# Altium footprint library discrete.PcbLib: 79 footprints (part 3 of 5)
Each footprint in its own frame and in the unit in brackets; x right, y up, seen from the top. Pads: shape width x height; smd on the part's side, far side on the other; paste and mask are expansions set on the pad; w line width, h text height; cw(c..) or ccw(c..) is an arc to the next point about the centre after c.
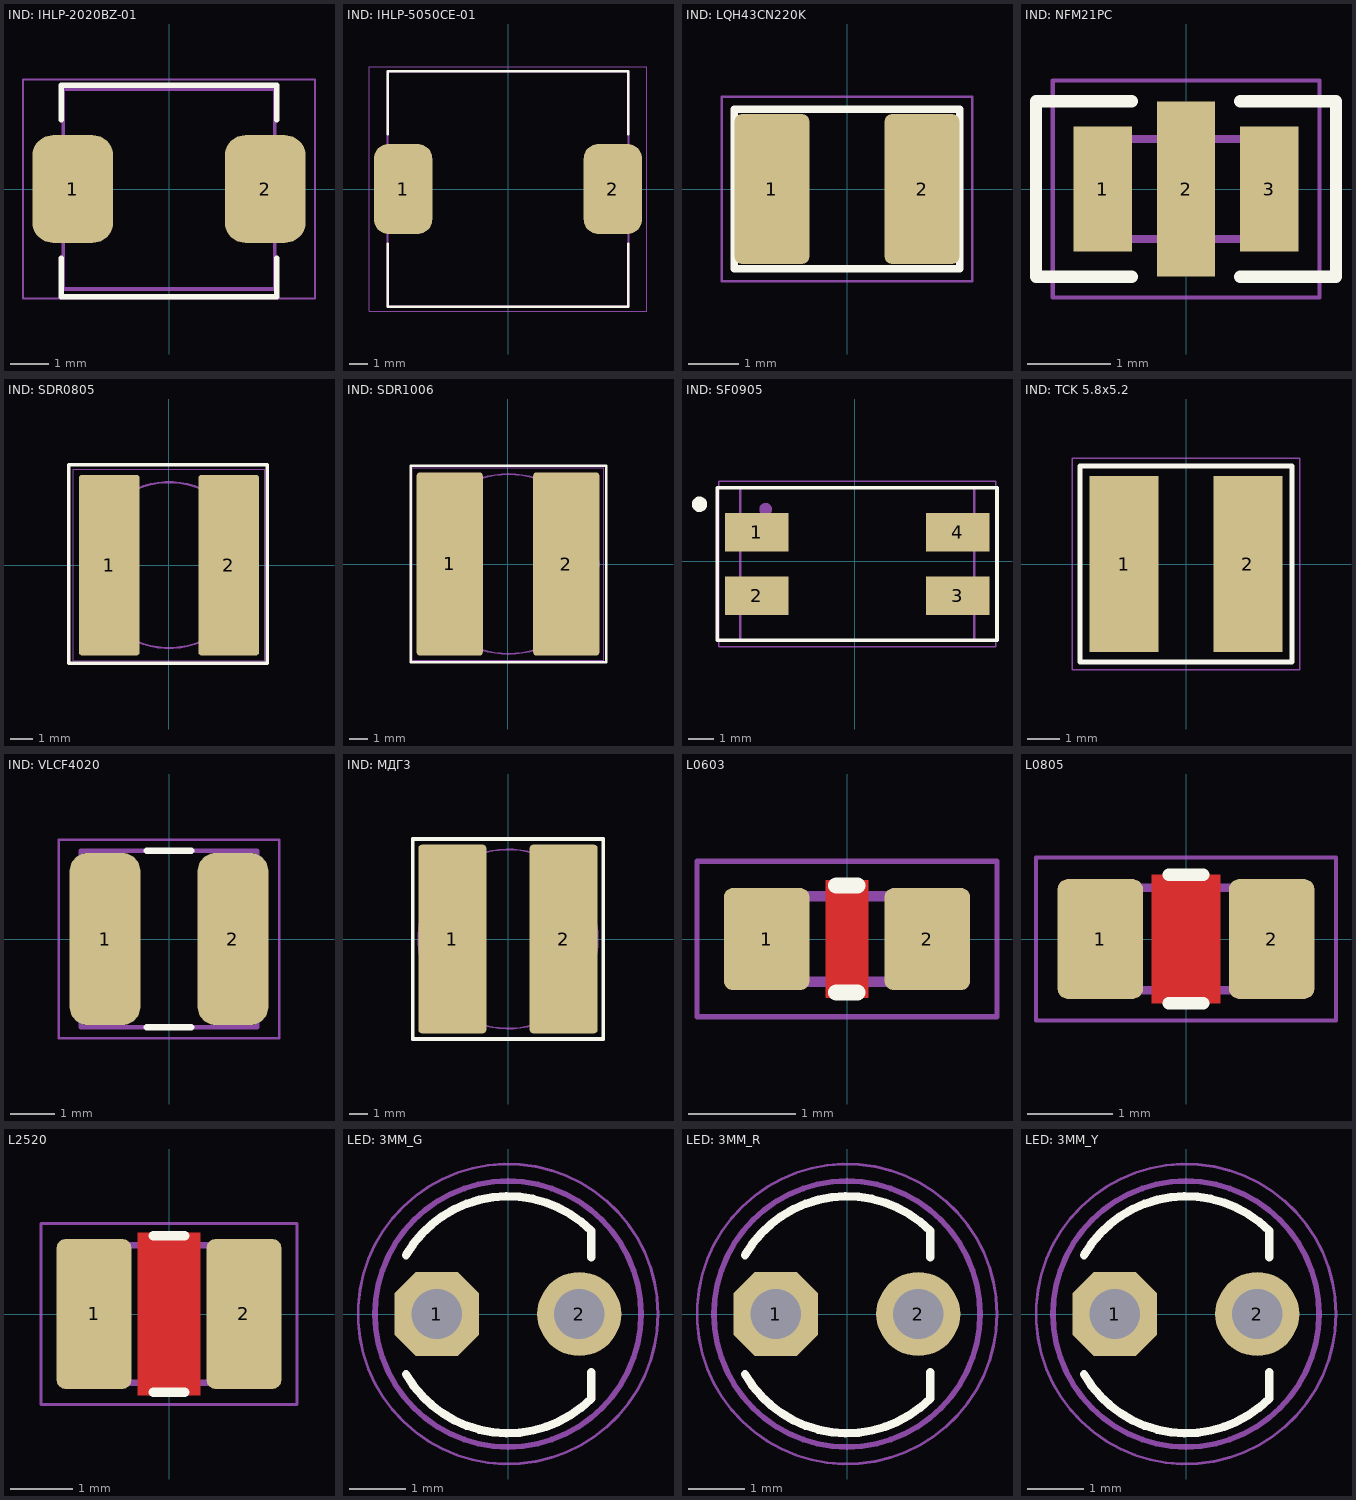
[diagram p2: the footprints below, top view; thin cyan lines are the x and y axes]

## IND: IHLP-2020BZ-01 [mm]
pads (2):
  rrect50% 2.1x2.8 smd: 1(-2.5,0) 2(2.5,0)
Top Overlay:
  lines w0.15: -2.8,-1.8 -2.8,-2.8 2.8,-2.8 2.8,-1.8 ; -2.8,1.8 -2.8,2.7 2.8,2.7 2.8,1.8
Top Assy:
  lines w0.1: -2.75,-2.6 -2.75,2.6 2.75,2.6 2.75,-2.6 -2.75,-2.6
  text ".Designator" at -1.325,-0.433 h1.25
Top Cortyard:
  lines w0.05: -3.8,-2.85 3.8,-2.85 3.8,2.85 -3.8,2.85 -3.8,-2.85
3D body "User Library-IHLP-2020BZ-01.step": height 2, standoff 0, extent -2.745,-2.59 2.745,2.59

## IND: IHLP-5050CE-01 [mm]
pads (2):
  rrect50% 3.2x4.95 smd: 1(-5.75,0) 2(5.75,0)
Top Overlay:
  lines w0.15: -6.6,-3 -6.6,-6.45 6.6,-6.45 6.6,-3 ; -6.6,3 -6.6,6.45 6.6,6.45 6.6,3
Top Assy:
  lines w0.1: -6.6,-6.45 6.6,-6.45 6.6,6.45 -6.6,6.45 -6.6,-6.45
  text ".Designator" at -2.35,-0.359 h2
Top Cortyard:
  lines w0.05: -7.6,-6.7 -7.6,6.7 7.6,6.7 7.6,-6.7 -7.6,-6.7
3D body: height 3.5, standoff 0, extent -6.6,-6.45 6.6,6.45

## IND: LQH43CN220K [mm]
height 16.8
pads (2):
  rrect20% 1.5x3 smd: 1(-1.5,0) 2(1.5,0)
Top Overlay:
  lines w0.15: -2.25,-1.6 2.25,-1.6 2.25,1.6 -2.25,1.6 -2.25,-1.6
Top Assy:
  lines w0.1: -2.25,-1.6 -2.25,1.6 2.25,1.6 2.25,-1.6 -2.25,-1.6
  text ".Designator" at -1.125,-0.417 h1
Top Cortyard:
  lines w0.05: -2.5,-1.85 -2.5,1.85 2.5,1.85 2.5,-1.85 -2.5,-1.85
3D body: height 2.6, standoff 0, extent -2.25,-1.6 2.25,1.6

## IND: NFM21PC [mm]
pads (3):
  rect 0.7x1.5 smd: 1(-1,0) 3(1,0)
  rect 0.7x2.1 smd: 2(0,0)
Top Overlay:
  lines w0.15: -0.65,-1.05 -1.8,-1.05 -1.8,1.05 -0.65,1.05 ; 0.65,-1.05 1.8,-1.05 1.8,1.05 0.65,1.05
Top Assy:
  lines w0.1: -1,-0.6 1,-0.6 1,0.6 -1,0.6 -1,-0.6
  text ".Designator" at -0.475,-0.183 h0.5
Top Cortyard:
  lines w0.05: -1.6,-1.3 1.6,-1.3 1.6,1.3 -1.6,1.3 -1.6,-1.3
3D body "User Library-NFM21PC.step": height 0.87, standoff 0, extent -1.01,-0.635 1.01,0.635

## IND: SDR0805 [mm] "SMD Power Inductors"
height 5.3
pads (2):
  rrect10% 2.7x8 smd: 1(-2.65,0) 2(2.65,0)
Top Overlay:
  lines w0.15: -4.45,-4.35 -4.45,4.45 4.35,4.45 4.35,-4.35 -4.45,-4.35
Top Assy:
  circle w0.1: c0,0 r3.677
  text ".Designator" at -1.95,-0.308 h1.25
Top Cortyard:
  lines w0.05: -4.25,-4.25 -4.25,4.25 4.25,4.25 4.25,-4.25 -4.25,-4.25
3D body "SDR0805.step": height 5.05, standoff 0, extent -3.677,-3.75 3.677,3.75

## IND: SDR1006 [mm] "SMD Power Inductors"
height 5.8
pads (2):
  rrect10% 3.6x10 smd: 1(-3.175,0) 2(3.175,0)
Top Overlay:
  lines w0.15: -5.3,-5.35 5.35,-5.35 5.35,5.35 -5.3,5.35 -5.3,-5.35
Top Assy:
  circle w0.1: c0.025,0 r4.9
  text ".Designator" at -2.525,-0.158 h1.25
Top Cortyard:
  lines w0.05: -5.225,-5.25 -5.225,5.25 5.225,5.25 5.225,-5.25 -5.225,-5.25
3D body "SDR1006.step": height 5.83, standoff -0.13, extent -4.888,-4.9 4.888,4.9

## IND: SF0905 [mm]
pads (4):
  rect 2.5x1.5 smd: 1(-3.85,1.15) 2(-3.85,-1.35) 3(4.05,-1.35) 4(4.05,1.15)
Top Overlay:
  circle w0.4: c-6.1,2.25 r0.1
  lines w0.15: -5.4,-3.1 -5.4,2.9 5.6,2.9 5.6,-3.1 -5.4,-3.1
Top Assy:
  circle w0.3: c-3.5,2.05 r0.1
  lines w0.1: -4.5,-3.1 4.7,-3.1 4.7,2.9 -4.5,2.9 -4.5,-3.1
  text ".Designator" at -1.925,-0.417 h1
Top Cortyard:
  lines w0.05: -5.35,-3.35 -5.35,3.15 5.55,3.15 5.55,-3.35 -5.35,-3.35
3D body "User Library-Bourns - SRF0905.step": height 5, standoff 0, extent -4.5,-3.1 4.7,2.9

## IND: TCK 5.8x5.2 [mm]
pads (2):
  rect 2.15x5.5 smd: 1(-1.925,0) 2(1.925,0)
Top Overlay:
  lines w0.15: -3.3,-3.05 -3.3,3.05 3.3,3.05 3.3,-3.05 -3.3,-3.05
Top Assy:
  lines w0.1: -3.3,-3.05 3.3,-3.05 3.3,3.05 -3.3,3.05 -3.3,-3.05
  text ".Designator" at -1.55,-0.333 h1.25
Top Cortyard:
  lines w0.05: -3.55,-3.3 -3.55,3.3 3.55,3.3 3.55,-3.3 -3.55,-3.3

## IND: VLCF4020 [mm]
height 2
pads (2):
  rrect50% 1.6x3.9 smd: 1(-1.45,0) 2(1.45,0)
Top Overlay:
  lines w0.15: -0.5,-2 0.5,-2 ; -0.5,2 0.5,2
Top Assy:
  lines w0.1: -2,-2 2,-2 2,2 -2,2 -2,-2
  text ".Designator" at -1.2,-0.392 h1
Top Cortyard:
  lines w0.05: -2.5,-2.25 -2.5,2.25 2.5,2.25 2.5,-2.25 -2.5,-2.25
3D body "VLCF4020.step": height 2, standoff 0, extent -2.05,-2 2.05,2

## IND: МДГ3 [mm]
pads (2):
  rrect10% 3.6x10 smd: 1(-2.95,0) 2(2.95,0)
Top Overlay:
  lines w0.2: -5.05,-5.3 -5.05,5.3 5.05,5.3 5.05,-5.3 -5.05,-5.3
Top Assy:
  circle w0.1: c0,0 r4.75
  text ".Designator" at -2.1,-0.55 h1.5
Top Cortyard:
  lines w0.1: -5.1,-5.35 5.1,-5.35 5.1,5.35 -5.1,5.35 -5.1,-5.35

## L0603 [mm]
pads (2):
  rrect20% 0.8x0.95 smd: 1(-0.75,0) 2(0.75,0)
Top Layer:
  pour cut-out: 0.2,-0.55 0.2,0.55 -0.2,0.55 -0.2,-0.55
Top Overlay:
  lines w0.15: -0.1,-0.5 0.1,-0.5 ; -0.1,0.5 0.1,0.5
Top Assy:
  lines w0.1: -0.8,-0.4 0.8,-0.4 0.8,0.4 -0.8,0.4 -0.8,-0.4
  text ".Designator" at -0.678,-0.255 h0.5
Top Cortyard:
  lines w0.05: -1.4,-0.725 1.4,-0.725 1.4,0.725 -1.4,0.725 -1.4,-0.725
3D body "Chip2PinSM127P600-8N.step": height 0.8, standoff 0, extent -0.8,-0.4 0.8,0.4

## L0805 [mm]
pads (2):
  rrect25% 1x1.4 smd: 1(-1,0) 2(1,0)
Top Layer:
  pour cut-out: 0.4,-0.75 0.4,0.75 -0.4,0.75 -0.4,-0.75
Top Overlay:
  lines w0.15: -0.2,-0.75 0.2,-0.75 ; -0.2,0.75 0.2,0.75
Top Assy:
  lines w0.1: -0.949,-0.6 1.05,-0.6 1.05,0.6 -0.949,0.6 -0.949,-0.6
  text ".Designator" at -0.774,-0.225 h0.5
Top Cortyard:
  lines w0.05: -1.75,-0.95 1.75,-0.95 1.75,0.95 -1.75,0.95 -1.75,-0.95
3D body "User Library-FB_2012-1.STEP": height 0.85, standoff 0, extent -1,-0.625 1,0.625

## L2520 [mm] "2.5mm?2.0mm Metal Alloy Inductors"
height 1
pads (2):
  rrect25% 1.2x2.4 smd: 1(-1.2,0) 2(1.2,0)
Top Layer:
  pour cut-out: -0.5,1.3 -0.5,-1.3 0.5,-1.3 0.5,1.3
Top Overlay:
  lines w0.15: -0.25,-1.25 0.25,-1.25 ; -0.25,1.25 0.25,1.25
Top Assy:
  lines w0.1: -1.3,-1.1 -1.3,1.1 1.3,1.1 1.3,-1.1 -1.3,-1.1
  text ".Designator" at -0.836,-0.243 h0.5
Top Cortyard:
  lines w0.05: -2.05,-1.45 -2.05,1.45 2.05,1.45 2.05,-1.45 -2.05,-1.45
3D body "User Library-Chip Inductor.step": height 2, standoff 0, extent -1.25,-1.1 1.25,1.1

## LED: 3MM_G [mm] "Green Leaded Led, 3 mm"
height 12
pads (2):
  oct 1.5x1.5 hole 0.9: 1(-1.27,0)
  round 1.5 hole 0.9: 2(1.27,0)
Top Overlay:
  lines w0.15: -1.819,-1.075 ccw(c0,-0.025) 1.485,-1.51 1.485,-1.04 ; -1.819,1.05 cw(c0,0) 1.485,1.485 1.485,1.015
Top Assy:
  circle w0.1: c0,0 r2.372
  text ".Designator" at -1.2,-0.175 h0.75
Top Cortyard:
  circle w0.05: c0,0 r2.675
3D body "3mm_led_grn.STEP": height 12, standoff -1, extent -2,-2 2,2

## LED: 3MM_R [mm] "Red Leaded Led, 3 mm"
height 12
pads (2):
  oct 1.5x1.5 hole 0.9: 1(-1.27,0)
  round 1.5 hole 0.9: 2(1.27,0)
Top Overlay:
  lines w0.15: -1.819,-1.075 ccw(c0,-0.025) 1.485,-1.51 1.485,-1.04 ; -1.819,1.05 cw(c0,0) 1.485,1.485 1.485,1.015
Top Assy:
  circle w0.1: c0,0 r2.372
  text ".Designator" at -1.65,-0.25 h0.75
Top Cortyard:
  circle w0.05: c0,0 r2.675
3D body "3mm_led_red.STEP": height 12, standoff -1, extent -2,-2 2,2

## LED: 3MM_Y [mm] "Yellow Leaded Led, 3 mm"
height 12
pads (2):
  oct 1.5x1.5 hole 0.9: 1(-1.27,0)
  round 1.5 hole 0.9: 2(1.27,0)
Top Overlay:
  lines w0.15: 1.485,-1.51 cw(c0,-0.025) -1.819,-1.075 ccw(c0,-0.025) 1.485,-1.51 ; 1.485,-1.51 1.485,-1.04 1.485,-1.51 ; 1.485,1.485 ccw(c0,0) -1.819,1.05 cw(c0,0) 1.485,1.485 ; 1.485,1.485 1.485,1.015 1.485,1.485
Top Assy:
  circle w0.1: c0,0 r2.372
  text ".Designator" at -1.45,-0.25 h0.75
Top Cortyard:
  circle w0.05: c0,0 r2.675
3D body "3mm_led_yell.STEP": height 12, standoff -1, extent -2,-2 2,2